# Altium footprint library MainFPs.PcbLib: 206 footprints (part 6 of 13)
Each footprint in its own frame and in the unit in brackets; x right, y up, seen from the top. Pads: shape width x height; smd on the part's side, far side on the other; paste and mask are expansions set on the pad; w line width, h text height; cw(c..) or ccw(c..) is an arc to the next point about the centre after c.
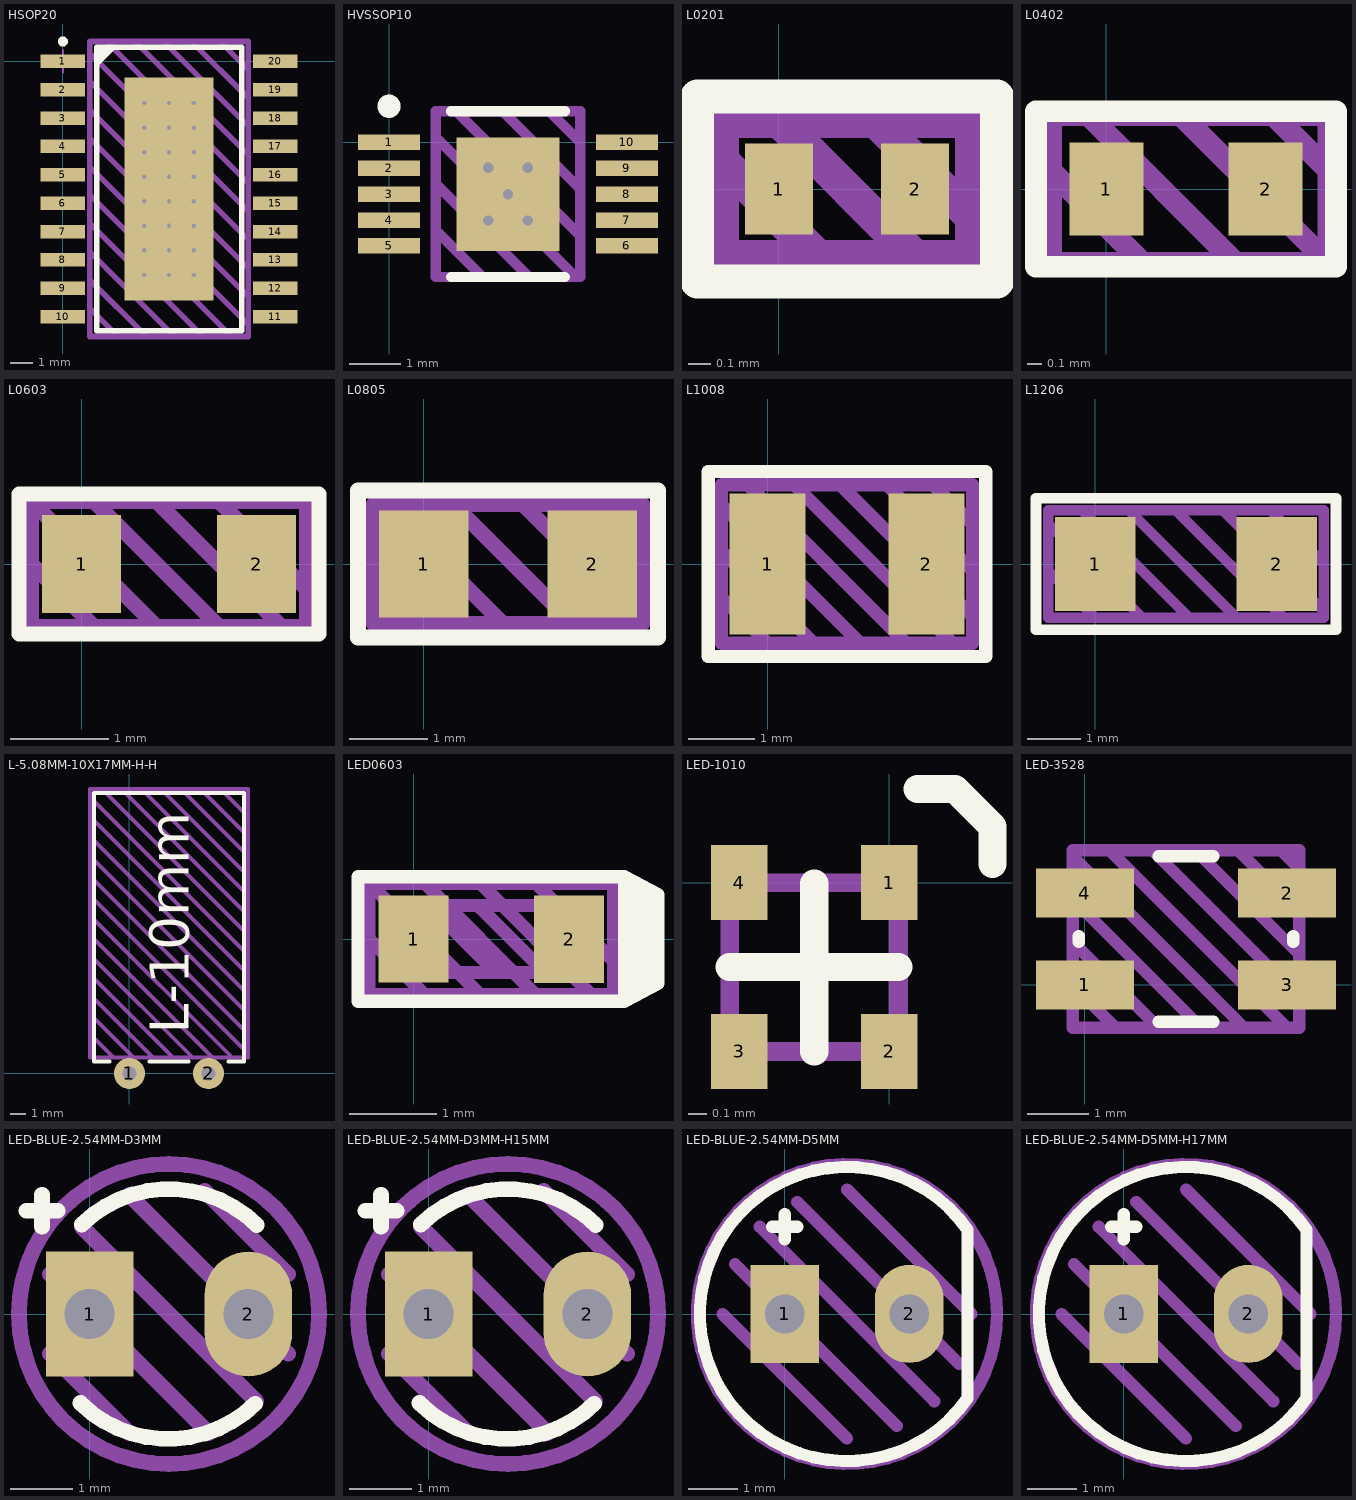
[diagram p5: the footprints below, top view; thin cyan lines are the x and y axes]

## HSOP20 [mm]
height 2.5
pads (21):
  rect 2x0.6 smd: 1(0,0) 2(0,-1.27) 3(0,-2.54) 4(0,-3.81) 5(0,-5.08) 6(0,-6.35) 7(0,-7.62) 8(0,-8.89) 9(0,-10.16) 10(0,-11.43) 11(9.5,-11.43) 12(9.5,-10.16) 13(9.5,-8.89) 14(9.5,-7.62) 15(9.5,-6.35) 16(9.5,-5.08) 17(9.5,-3.81) 18(9.5,-2.54) 19(9.5,-1.27) 20(9.5,0)
  rect 4x10 smd: ""(4.75,-5.715)
via 3.65,-9.565 diameter 0.5 hole 0.2
via 4.75,-9.565 diameter 0.5 hole 0.2
via 5.85,-9.565 diameter 0.5 hole 0.2
via 3.65,-8.465 diameter 0.5 hole 0.2
via 4.75,-8.465 diameter 0.5 hole 0.2
via 5.85,-8.465 diameter 0.5 hole 0.2
via 3.65,-1.865 diameter 0.5 hole 0.2
via 4.75,-1.865 diameter 0.5 hole 0.2
via 5.85,-1.865 diameter 0.5 hole 0.2
via 3.65,-2.965 diameter 0.5 hole 0.2
via 4.75,-2.965 diameter 0.5 hole 0.2
via 5.85,-2.965 diameter 0.5 hole 0.2
via 3.65,-4.065 diameter 0.5 hole 0.2
via 4.75,-4.065 diameter 0.5 hole 0.2
via 5.85,-4.065 diameter 0.5 hole 0.2
via 3.65,-5.165 diameter 0.5 hole 0.2
via 4.75,-5.165 diameter 0.5 hole 0.2
via 5.85,-5.165 diameter 0.5 hole 0.2
via 3.65,-6.265 diameter 0.5 hole 0.2
via 4.75,-6.265 diameter 0.5 hole 0.2
via 5.85,-6.265 diameter 0.5 hole 0.2
via 3.65,-7.365 diameter 0.5 hole 0.2
via 4.75,-7.365 diameter 0.5 hole 0.2
via 5.85,-7.365 diameter 0.5 hole 0.2
Top Overlay:
  circle w0.25: c0,0.889 r0.1
  region: 1.524,-0.254 2.413,0.635 1.524,0.635
  lines w0.25: 1.524,-12.065 1.524,0.635 8.001,0.635 8.001,-12.065 1.524,-12.065
Draw:
  lines w0.25: 1.194,-11.049 2.464,-12.319 ; 1.194,-9.779 3.734,-12.319 ; 1.194,-8.509 5.004,-12.319 ; 1.194,-7.239 6.274,-12.319 ; 1.194,-5.969 7.544,-12.319 ; 1.194,-4.699 8.306,-11.811 ; 1.194,-3.429 8.306,-10.541 ; 1.194,-2.159 8.306,-9.271 ; 1.194,-0.889 8.306,-8.001 ; 1.194,0.381 8.306,-6.731 ; 1.194,0.87 1.194,-12.319 8.306,-12.319 8.306,0.889 1.213,0.889 ; 1.956,0.889 8.306,-5.461 ; 3.226,0.889 8.306,-4.191 ; 4.496,0.889 8.306,-2.921 ; 5.766,0.889 8.306,-1.651 ; 7.036,0.889 8.306,-0.381
Info:
  text "'.Comment'" at 0.559,-13.716 h1
Mechanical 15:
  lines w0.1: -0.5,0 0.5,0 ; 0,-0.5 0,0.5
3D body "SOP127P600-8N.step": height 2.5, standoff 0, extent -0.45,-12.215 9.95,0.785

## HVSSOP10 [mm]
height 1.1
pads (11):
  rect 1.2x0.3 smd: 1(0,0) 2(0,-0.5) 3(0,-1) 4(0,-1.5) 5(0,-2) 6(4.6,-2) 7(4.6,-1.5) 8(4.6,-1) 9(4.6,-0.5) 10(4.6,0)
  rect 2x2.2 smd: ""(2.3,-1)
via 2.3,-1 diameter 0.4 hole 0.2
via 1.919,-1.508 diameter 0.4 hole 0.2
via 2.681,-1.508 diameter 0.4 hole 0.2
via 2.681,-0.492 diameter 0.4 hole 0.2
via 1.919,-0.492 diameter 0.4 hole 0.2
Top Overlay:
  circle w0.25: c0,0.7 r0.1
  lines w0.2: 1.2,-2.6 3.4,-2.6 ; 1.2,0.6 3.4,0.6
Draw:
  lines w0.2: 0.9,-1.7 1.8,-2.6 ; 0.9,-0.8 2.7,-2.6 ; 0.9,0.1 3.6,-2.6 ; 1.3,0.6 3.7,-1.8 ; 2.2,0.6 3.7,-0.9 ; 3.1,0.6 3.7,0 ; 0.9,-2.6 3.7,-2.6 3.7,0.6 0.9,0.6 0.9,-2.6
Info:
  text "'.Comment'" at -0.886,-3.737 h0.75
3D body "HVSSOP10.step": height 1.1, standoff 0, extent -0.162,-2.55 4.763,0.55

## L0201 [mm]
height 0.3
pads (2):
  rect 0.3x0.4 smd: 1(0,0) 2(0.6,0)
Top Overlay:
  lines w0.15: -0.36,-0.406 -0.36,0.406 0.96,0.406 0.96,0.381 0.96,-0.406 -0.36,-0.406
Draw:
  lines w0.15: -0.25,0.125 0.175,-0.3 ; 0,0.3 0.6,-0.3 ; 0.425,0.3 0.85,-0.125 ; -0.25,-0.3 0.85,-0.3 0.85,0.3 -0.25,0.3 -0.25,-0.3
Info:
  text "'.Comment'" at -0.762,-0.846 h0.25
3D body "L0201.step": height 0.3, standoff 0, extent 0,-0.15 0.6,0.15

## L0402 [mil]
pads (2):
  rect 20x25 smd: 1(0,0) 2(43,0)
Top Overlay:
  lines w5.91: -19,-21 62,-21 62,21 -19,21 -19,-21
Draw:
  lines w5.91: -15,5 10,-20 ; -5,20 35,-20 ; 20,20 60,-20 ; 45,20 60,5 ; 60,-20 -15,-20 -15,20 60,20 60,-20
Info:
  text "'.Comment'" at -38.86,-43.47 h13.78
3D body "Chip2PinSM127P600-8N.step": height 13.78, standoff 0, extent 2,-10 41.37,9.68

## L0603 [mm]
pads (2):
  rect 0.8x1 smd: 1(0,0) 2(1.778,0)
Top Overlay:
  lines w0.15: -0.635,-0.711 -0.635,0.711 2.413,0.711 2.413,-0.711 -0.635,-0.711
Draw:
  lines w0.15: -0.508,0 0.127,-0.635 ; 0.127,0.635 1.397,-0.635 ; 0.762,-0.635 -0.508,0.635 ; 0.762,0.635 2.032,-0.635 ; 1.397,0.635 2.286,-0.254 ; -0.508,0.635 -0.508,-0.635 2.286,-0.635 2.286,0.635 -0.508,0.635
Info:
  text "'.Comment'" at -1.224,-1.492 h0.5
3D body "Chip2PinSM127P600-8N11.step": height 0.45, standoff 0, extent 0.114,-0.425 1.664,0.425

## L0805 [mil]
pads (2):
  rect 45x54 smd: 1(0,0) 2(85,0)
Top Overlay:
  lines w7.87: -33,-37 -33,37 118,37 118,-37 -33,-37
Draw:
  lines w7.87: -25,0 5,-30 ; -20,30 40,-30 ; 15,30 75,-30 ; 35,-30 42.5,-30 ; 50,30 110,-30 ; 85,30 110,5 ; 110,-30 110,30 -25,30 -25,-30 110,-30
Info:
  text "'.Comment'" at -82.14,-84.15 h29.53
3D body "Chip2PinSM127P600-8N.step": height 23.62, standoff 0, extent 3.63,-23.62 82.37,23.62

## L1008 [mm]
pads (2):
  rect 1.15x2.14 smd: 1(0,0) 2(2.4,0)
Top Overlay:
  lines w0.2: -0.9,-1.4 -0.9,1.4 3.3,1.4 3.3,-1.4 -0.9,-1.4
Draw:
  lines w0.2: -0.7,-0.5 0,-1.2 ; -0.7,0.2 0.7,-1.2 ; -0.7,0.9 1.4,-1.2 ; -0.3,1.2 2.1,-1.2 ; 0.4,1.2 2.8,-1.2 ; 1.1,1.2 3.1,-0.8 ; 1.8,1.2 3.1,-0.1 ; 2.5,1.2 3.1,0.6 ; -0.7,-1.2 -0.7,1.2 3.1,1.2 3.1,-1.2 -0.7,-1.2
Info:
  text "'.Comment'" at -1.986,-2.537 h0.75
3D body "INDC2520X09N.step": height 0.9, standoff 0, extent -0.05,-1 2.45,1

## L1206 [mil]
pads (2):
  rect 60x70 smd: 1(0,0) 2(135,0)
Top Overlay:
  lines w7.87: -44,-49 -44,49 179,49 179,-49 -44,-49
Draw:
  lines w7.87: -35,-5 0,-40 ; -35,30 35,-40 ; -10,40 70,-40 ; 25,40 105,-40 ; 60,40 140,-40 ; 95,40 170,-35 ; 130,40 170,0 ; -35,-40 -35,40 170,40 170,-40 -35,-40
Info:
  text "'.Comment'" at -58.52,-95.96 h29.53
3D body "Chip2PinSM127P600-8N.step": height 23.62, standoff 0, extent 5.01,-31.49 131,31.5

## L-5.08MM-10X17MM-H-H [mm]
pads (2):
  round 2 hole 0.9: 1(0,0) 2(5.08,0)
Top Overlay:
  lines w0.25: -1.27,0.762 -2.286,0.762 -2.286,18.034 7.366,18.034 7.366,0.762 6.35,0.762 ; 1.27,0.762 3.81,0.762
  text "L-10mm" at 3.81,2.54 h2.5
Draw:
  lines w0.25: -2.54,2.54 -1.016,1.016 0,1.016 ; -2.54,3.81 0.254,1.016 ; -2.54,5.08 1.524,1.016 3.81,1.016 ; -2.54,6.35 2.794,1.016 5.08,1.016 4.064,1.016 -2.54,7.62 ; -2.54,8.89 5.334,1.016 6.35,1.016 ; -2.54,10.16 6.604,1.016 7.62,1.016 ; -2.54,11.43 7.62,1.27 7.62,2.54 ; -2.54,12.7 7.62,2.54 ; -2.54,15.24 7.62,5.08 7.62,3.81 ; -1.016,18.288 -0.508,18.288 7.62,10.16 ; 0.762,18.288 7.62,11.43 ; 2.032,18.288 7.62,12.7 ; 2.794,18.288 3.302,18.288 ; 7.112,18.288 7.62,17.78 ; 7.62,8.89 -1.778,18.288 -2.54,18.288 ; 7.62,13.97 3.302,18.288 ; 7.62,15.24 4.572,18.288 ; 7.62,16.51 5.842,18.288 4.572,18.288 ; -2.54,13.97 7.62,3.81 ; -2.54,13.97 7.62,3.81 ; -2.54,13.97 -2.54,16.51 7.62,6.35 ; -2.54,13.97 7.62,3.81 ; -2.54,13.97 -2.54,17.78 7.62,7.62 7.62,6.35 ; -2.54,18.288 -2.54,1.016 7.62,1.016 ; -2.54,18.288 7.62,18.288 7.62,1.016 ; 3.302,18.288 4.572,18.288 ; 7.62,2.54 7.62,3.81 ; 7.62,3.81 7.62,6.35
Info:
  text "'.Comment'" at 6.858,2.032 h1.7
3D body: height 9.7, standoff 0.3, extent -2.158,4.318 7.242,4.418
3D body: height 9.7, standoff 0.3, extent -2.158,6.096 7.242,6.196
3D body: height 9.7, standoff 0.3, extent -2.158,5.969 7.242,6.069
3D body: height 9.7, standoff 0.3, extent -2.158,5.842 7.242,5.942
3D body: height 9.7, standoff 0.3, extent -2.158,5.715 7.242,5.815
3D body: height 9.7, standoff 0.3, extent -2.158,5.588 7.242,5.688
3D body: height 9.7, standoff 0.3, extent -2.158,5.461 7.242,5.561
3D body: height 9.7, standoff 0.3, extent -2.158,5.334 7.242,5.434
3D body: height 9.7, standoff 0.3, extent -2.158,5.207 7.242,5.307
3D body: height 9.7, standoff 0.3, extent -2.158,5.08 7.242,5.18
3D body: height 9.7, standoff 0.3, extent -2.158,4.953 7.242,5.053
3D body: height 9.7, standoff 0.3, extent -2.158,4.826 7.242,4.926
3D body: height 9.7, standoff 0.3, extent -2.158,4.699 7.242,4.799
3D body: height 9.7, standoff 0.3, extent -2.158,9.018 7.242,9.118
3D body: height 9.7, standoff 0.3, extent -2.158,8.891 7.242,8.991
3D body: height 9.7, standoff 0.3, extent -2.158,6.224 7.242,6.324
3D body: height 9.7, standoff 0.3, extent -2.158,6.351 7.242,6.451
3D body: height 9.7, standoff 0.3, extent -2.158,6.478 7.242,6.578
3D body: height 9.7, standoff 0.3, extent -2.158,6.605 7.242,6.705
3D body: height 9.7, standoff 0.3, extent -2.158,6.732 7.242,6.832
3D body: height 9.7, standoff 0.3, extent -2.158,6.859 7.242,6.959
3D body: height 9.7, standoff 0.3, extent -2.158,6.986 7.242,7.086
3D body: height 9.7, standoff 0.3, extent -2.158,7.113 7.242,7.213
3D body: height 9.7, standoff 0.3, extent -2.158,7.24 7.242,7.34
3D body: height 9.7, standoff 0.3, extent -2.158,7.367 7.242,7.467
3D body: height 9.7, standoff 0.3, extent -2.158,7.494 7.242,7.594
3D body: height 9.7, standoff 0.3, extent -2.158,7.621 7.242,7.721
3D body: height 9.7, standoff 0.3, extent -2.158,7.748 7.242,7.848
3D body: height 9.7, standoff 0.3, extent -2.158,7.875 7.242,7.975
3D body: height 9.7, standoff 0.3, extent -2.158,8.764 7.242,8.864
3D body: height 9.7, standoff 0.3, extent -2.158,8.637 7.242,8.737
3D body: height 9.7, standoff 0.3, extent -2.158,8.51 7.242,8.61
3D body: height 9.7, standoff 0.3, extent -2.158,8.383 7.242,8.483
3D body: height 9.7, standoff 0.3, extent -2.158,8.256 7.242,8.356
3D body: height 9.7, standoff 0.3, extent -2.158,8.129 7.242,8.229
3D body: height 9.7, standoff 0.3, extent -2.158,8.002 7.242,8.102
3D body: height 9.7, standoff 0.3, extent -2.158,11.94 7.242,12.04
3D body: height 9.7, standoff 0.3, extent -2.158,11.813 7.242,11.913
3D body: height 9.7, standoff 0.3, extent -2.158,9.146 7.242,9.246
3D body: height 9.7, standoff 0.3, extent -2.158,9.273 7.242,9.373
3D body: height 9.7, standoff 0.3, extent -2.158,9.4 7.242,9.5
3D body: height 9.7, standoff 0.3, extent -2.158,9.527 7.242,9.627
3D body: height 9.7, standoff 0.3, extent -2.158,9.654 7.242,9.754
3D body: height 9.7, standoff 0.3, extent -2.158,9.781 7.242,9.881
3D body: height 9.7, standoff 0.3, extent -2.158,9.908 7.242,10.008
3D body: height 9.7, standoff 0.3, extent -2.158,10.035 7.242,10.135
3D body: height 9.7, standoff 0.3, extent -2.158,10.162 7.242,10.262
3D body: height 9.7, standoff 0.3, extent -2.158,10.289 7.242,10.389
3D body: height 9.7, standoff 0.3, extent -2.158,10.416 7.242,10.516
3D body: height 9.7, standoff 0.3, extent -2.158,10.543 7.242,10.643
3D body: height 9.7, standoff 0.3, extent -2.158,10.67 7.242,10.77
3D body: height 9.7, standoff 0.3, extent -2.158,10.797 7.242,10.897
3D body: height 9.7, standoff 0.3, extent -2.158,11.686 7.242,11.786
3D body: height 9.7, standoff 0.3, extent -2.158,11.559 7.242,11.659
3D body: height 9.7, standoff 0.3, extent -2.158,11.432 7.242,11.532
3D body: height 9.7, standoff 0.3, extent -2.158,11.305 7.242,11.405
3D body: height 9.7, standoff 0.3, extent -2.158,11.178 7.242,11.278
3D body: height 9.7, standoff 0.3, extent -2.158,11.051 7.242,11.151
3D body: height 9.7, standoff 0.3, extent -2.158,10.924 7.242,11.024
3D body: height 5.25, standoff 4.75, extent -0.254,0 0.254,1.27
3D body: height 5, standoff -1.78, extent 4.825,-0.254 5.333,0.254
3D body: height 9.7, standoff 0.3, extent -2.158,13.844 7.242,13.944
3D body: height 9.7, standoff 0.3, extent -2.158,13.971 7.242,14.071
3D body: height 9.7, standoff 0.3, extent -2.158,14.098 7.242,14.198
3D body: height 9.7, standoff 0.3, extent -2.158,14.225 7.242,14.325
3D body: height 9.7, standoff 0.3, extent -2.158,14.352 7.242,14.452
3D body: height 9.7, standoff 0.3, extent -2.158,14.479 7.242,14.579
3D body: height 9.7, standoff 0.3, extent -2.158,14.606 7.242,14.706
3D body: height 9.3, standoff 0.7, extent -1.76,4.152 6.84,15.152
3D body: height 10, standoff 0, extent -2.46,14.986 7.54,18.186
3D body: height 10, standoff 0, extent -2.46,1.096 7.54,4.296
3D body: height 9.7, standoff 0.3, extent -2.158,13.717 7.242,13.817
3D body: height 9.7, standoff 0.3, extent -2.158,13.59 7.242,13.69
3D body: height 9.7, standoff 0.3, extent -2.158,13.463 7.242,13.563
3D body: height 9.7, standoff 0.3, extent -2.158,13.336 7.242,13.436
3D body: height 9.7, standoff 0.3, extent -2.158,13.209 7.242,13.309
3D body: height 9.7, standoff 0.3, extent -2.158,13.082 7.242,13.182
3D body: height 9.7, standoff 0.3, extent -2.158,12.955 7.242,13.055
3D body: height 9.7, standoff 0.3, extent -2.158,12.828 7.242,12.928
3D body: height 9.7, standoff 0.3, extent -2.158,12.701 7.242,12.801
3D body: height 9.7, standoff 0.3, extent -2.158,12.574 7.242,12.674
3D body: height 9.7, standoff 0.3, extent -2.158,12.447 7.242,12.547
3D body: height 9.7, standoff 0.3, extent -2.158,12.32 7.242,12.42
3D body: height 9.7, standoff 0.3, extent -2.158,12.193 7.242,12.293
3D body: height 9.7, standoff 0.3, extent -2.158,12.066 7.242,12.166
3D body: height 9.7, standoff 0.3, extent -2.158,14.733 7.242,14.833
3D body: height 9.7, standoff 0.3, extent -2.158,14.86 7.242,14.96
3D body: height 5.25, standoff 4.75, extent 4.826,-0.254 5.334,0.254
3D body: height 5, standoff -1.78, extent -0.254,-0.254 0.254,0.254
3D body: height 5.25, standoff 4.75, extent 4.825,-0.254 5.333,0.254
3D body: height 5.25, standoff 4.75, extent 4.826,0 5.334,1.27
3D body: height 5.25, standoff 4.75, extent -0.252,-0.254 0.256,0.254
3D body: height 9.7, standoff 0.3, extent -2.158,4.445 7.242,4.545
3D body: height 9.7, standoff 0.3, extent -2.158,4.572 7.242,4.672

## LED0603 [mm]
pads (2):
  rect 0.8x1 smd: 1(0,0) 2(1.778,0)
Top Overlay:
  region: 2.413,0.711 2.413,-0.711 2.794,-0.508 2.794,0.508
  lines w0.15: 2.413,-0.711 2.794,-0.508 2.794,0.508 2.413,0.711 ; 2.413,-0.711 -0.635,-0.711 -0.635,0.711 2.413,0.711 ; 2.413,-0.711 2.413,0.711
Draw:
  lines w0.15: -0.508,0 0.127,-0.635 ; 0.127,0.635 1.397,-0.635 ; 0.761,0.356 1.498,-0.381 ; 0.762,-0.635 -0.508,0.635 ; 0.762,0.635 2.032,-0.635 ; 0.939,-0.381 0.177,0.381 ; 1.397,0.635 2.286,-0.254 ; -0.508,0.635 2.286,0.635 2.286,-0.635 -0.508,-0.635 -0.508,0.635 ; 0.177,0.381 1.498,0.381 1.498,-0.381 ; 0.177,0.381 0.177,-0.381 1.498,-0.381
Info:
  text "'.Comment'" at -0.635,-1.346 h0.4
3D body: height 0.11, standoff 0.06, extent 1.552,-0.387 1.702,0.388
3D body: height 0.1, standoff 0, extent -0.073,-0.45 0.426,0.45
3D body: height 0.1, standoff 0, extent 1.352,-0.45 1.851,0.45
3D body: height 0.09, standoff 0.05, extent 0.076,-0.432 1.702,0.432
3D body: height 0.4, standoff 0.09, extent 0.076,-0.432 1.702,0.432
3D body: height 0.15, standoff 0.1, extent 0.677,-0.2 1.077,0.2

## LED-1010 [mm]
pads (4):
  rect 0.3x0.4 smd: 1(0,0) 2(0,-0.9) 3(-0.8,-0.9) 4(-0.8,0)
Top Overlay:
  lines w0.15: -0.85,-0.45 0.05,-0.45 ; -0.4,-0.9 -0.4,-0.004 ; 0.15,0.5 0.35,0.5 0.55,0.3 0.55,0.1
Draw:
  lines w0.1: -0.85,-0.45 0.05,-0.45 ; -0.4,-0.9 -0.4,0 ; -0.85,-0.9 0.05,-0.9 0.05,0 -0.85,0 -0.85,-0.9
Info:
  text "'.Comment'" at -1.462,-1.596 h0.25
3D body: height 0.17, standoff 0.15, extent -0.58,-0.86 -0.2,-0.54
3D body: height 0.16, standoff 0.14, extent -0.85,-0.9 0.05,0
3D body: height 0.15, standoff 0, extent -0.2,-0.96 0.08,-0.65
3D body: height 0.15, standoff 0, extent -0.2,-0.25 0.08,0.06
3D body: height 0.15, standoff 0, extent -0.88,-0.25 -0.6,0.06
3D body: height 0.15, standoff 0, extent -0.88,-0.96 -0.6,-0.65
3D body: height 0.6, standoff 0.05, extent -0.9,-0.95 0.1,0.05
3D body: height 0.2, standoff 0.15, extent -0.6,-0.496 -0.2,-0.223
3D body: height 0.2, standoff 0.15, extent -0.84,-0.38 0.04,-0.001
3D body: height 0.17, standoff 0.15, extent -0.21,-0.86 -0.103,-0.82

## LED-3528 [mm]
pads (4):
  rect 1.6x0.8 smd: 1(0,0) 2(3.3,1.5) 3(3.3,0) 4(0,1.5)
Top Overlay:
  lines w0.2: -0.1,0.7 -0.1,0.8 ; 1.2,-0.6 2.1,-0.6 ; 1.2,2.1 2.1,2.1 ; 3.4,0.7 3.4,0.8
Draw:
  lines w0.2: -0.2,0 0.5,-0.7 ; -0.2,0.7 1.2,-0.7 ; -0.2,1.4 1.9,-0.7 ; -0.2,2.1 2.6,-0.7 ; 0.4,2.2 3.3,-0.7 ; 1.1,2.2 3.5,-0.2 3.5,-0.5 ; 1.7,2.2 1.8,2.2 3.5,0.5 ; 2.5,2.2 3.5,1.2 ; 3.2,2.2 3.5,1.9 ; -0.2,-0.7 3.5,-0.7 3.5,2.2 -0.2,2.2 -0.2,-0.7
Info:
  text "'.Comment'" at -1.536,-1.937 h0.75

## LED-BLUE-2.54MM-D3MM [mm]
pads (2):
  rect 1.4x2 hole 0.8: 1(0,0)
  oval 1.4x2 hole 0.8: 2(2.54,0)
Top Overlay:
  lines w0.25: -1.016,1.651 -0.508,1.651 ; -0.762,1.397 -0.762,1.905 ; -0.147,-1.425 ccw(c1.257,-0.001) 2.653,-1.434 ; -0.125,1.433 cw(c1.27,0) 2.674,1.424
Draw:
  circle w0.25: c1.27,0 r2.4
  lines w0.25: -0.635,-0.635 0.635,-1.905 ; -0.635,0.635 1.905,-1.905 ; -0.127,1.397 2.667,-1.397 ; 0.635,1.905 3.175,-0.635 ; 1.841,1.968 3.175,0.635
Info:
  text "'.Comment'" at -1.705,-3.61 h1
3D body: height 0.5, standoff -3, extent 2.29,-0.25 2.79,0.25
3D body: height 3.7, standoff 1, extent -0.23,-1.5 2.77,1.5
3D body: height 5.3, standoff 2.3, extent -0.236,-1.5 2.764,1.5
3D body: height 0.5, standoff -3, extent -0.25,-0.25 0.25,0.25
3D body: height 1, standoff 0, extent -0.63,-1.91 2.77,1.91

## LED-BLUE-2.54MM-D3MM-H15MM [mm]
pads (2):
  rect 1.4x2 hole 0.8: 1(0,0)
  oval 1.4x2 hole 0.8: 2(2.54,0)
Top Overlay:
  lines w0.25: -1.016,1.651 -0.508,1.651 ; -0.762,1.397 -0.762,1.905 ; -0.147,-1.425 ccw(c1.258,-0.001) 2.653,-1.433 ; -0.125,1.433 cw(c1.27,0) 2.674,1.424
Draw:
  circle w0.25: c1.27,0 r2.4
  lines w0.25: -0.635,-0.635 0.635,-1.905 ; -0.635,0.635 1.905,-1.905 ; -0.127,1.397 2.667,-1.397 ; 0.635,1.905 3.175,-0.635 ; 1.842,1.969 3.175,0.635
Info:
  text "'.Comment'" at -1.705,-3.61 h1
3D body: height 7.8, standoff 7, extent 2.24,-0.25 2.84,0.25
3D body: height 7.8, standoff 7, extent -0.3,-0.25 0.3,0.25
3D body: height 10.7, standoff 9.7, extent -0.63,-1.91 2.77,1.91
3D body: height 10, standoff -3, extent -0.25,-0.25 0.25,0.25
3D body: height 15, standoff 12, extent -0.236,-1.5 2.764,1.5
3D body: height 13.4, standoff 10.7, extent -0.23,-1.5 2.77,1.5
3D body: height 10, standoff -3, extent 2.29,-0.25 2.79,0.25

## LED-BLUE-2.54MM-D5MM [mm]
pads (2):
  rect 1.4x2 hole 0.8: 1(0,0)
  oval 1.4x2 hole 0.8: 2(2.54,0)
Top Overlay:
  lines w0.25: -0.254,1.778 -0.127,1.778 0.127,1.778 0.254,1.778 ; 0,1.524 0,2.032 ; 3.727,-1.721 cw(c1.27,0) 3.727,1.721 3.727,-1.721
Draw:
  circle w0.25: c1.27,0 r3.059
  lines w0.25: -1.27,0 1.27,-2.54 ; -1.016,1.016 2.286,-2.286 ; -0.508,1.778 3.048,-1.778 ; 0.254,2.286 3.556,-1.016 ; 1.27,2.54 3.81,0
Info:
  text "'.Comment'" at -1.578,-4.372 h1
3D body: height 1, standoff 0, extent -1.63,-2.909 3.77,2.909
3D body: height 7.7, standoff 2.7, extent -1.236,-2.5 3.764,2.5
3D body: height 5.2, standoff 1, extent -1.23,-2.5 3.77,2.5
3D body: height 0.5, standoff -3, extent 2.29,-0.25 2.79,0.25
3D body: height 0.5, standoff -3, extent -0.25,-0.25 0.25,0.25

## LED-BLUE-2.54MM-D5MM-H17MM [mm]
pads (2):
  rect 1.4x2 hole 0.8: 1(0,0)
  oval 1.4x2 hole 0.8: 2(2.54,0)
Top Overlay:
  lines w0.25: -0.254,1.778 -0.127,1.778 0.127,1.778 0.254,1.778 ; 0,1.524 0,2.032 ; 3.727,-1.721 cw(c1.27,0) 3.727,1.721 3.727,-1.721
Draw:
  circle w0.25: c1.27,0 r3.059
  lines w0.25: -1.27,0 1.27,-2.54 ; -1.016,1.016 2.286,-2.286 ; -0.508,1.778 3.048,-1.778 ; 0.254,2.286 3.556,-1.016 ; 1.27,2.54 3.81,0
Info:
  text "'.Comment'" at -1.578,-4.372 h1
3D body: height 10, standoff -3, extent 2.29,-0.25 2.79,0.25
3D body: height 10, standoff -3, extent -0.25,-0.25 0.25,0.25
3D body: height 7.8, standoff 7, extent -0.3,-0.25 0.3,0.25
3D body: height 7.8, standoff 7, extent 2.24,-0.25 2.84,0.25
3D body: height 14.5, standoff 10.3, extent -1.23,-2.5 3.77,2.5
3D body: height 17, standoff 12, extent -1.236,-2.5 3.764,2.5
3D body: height 10.3, standoff 9.3, extent -1.63,-2.909 3.77,2.909